# Altium footprint library ASM001-design.PcbLib: 42 footprints (part 2 of 3)
Each footprint in its own frame and in the unit in brackets; x right, y up, seen from the top. Pads: shape width x height; smd on the part's side, far side on the other; paste and mask are expansions set on the pad; w line width, h text height; cw(c..) or ccw(c..) is an arc to the next point about the centre after c.
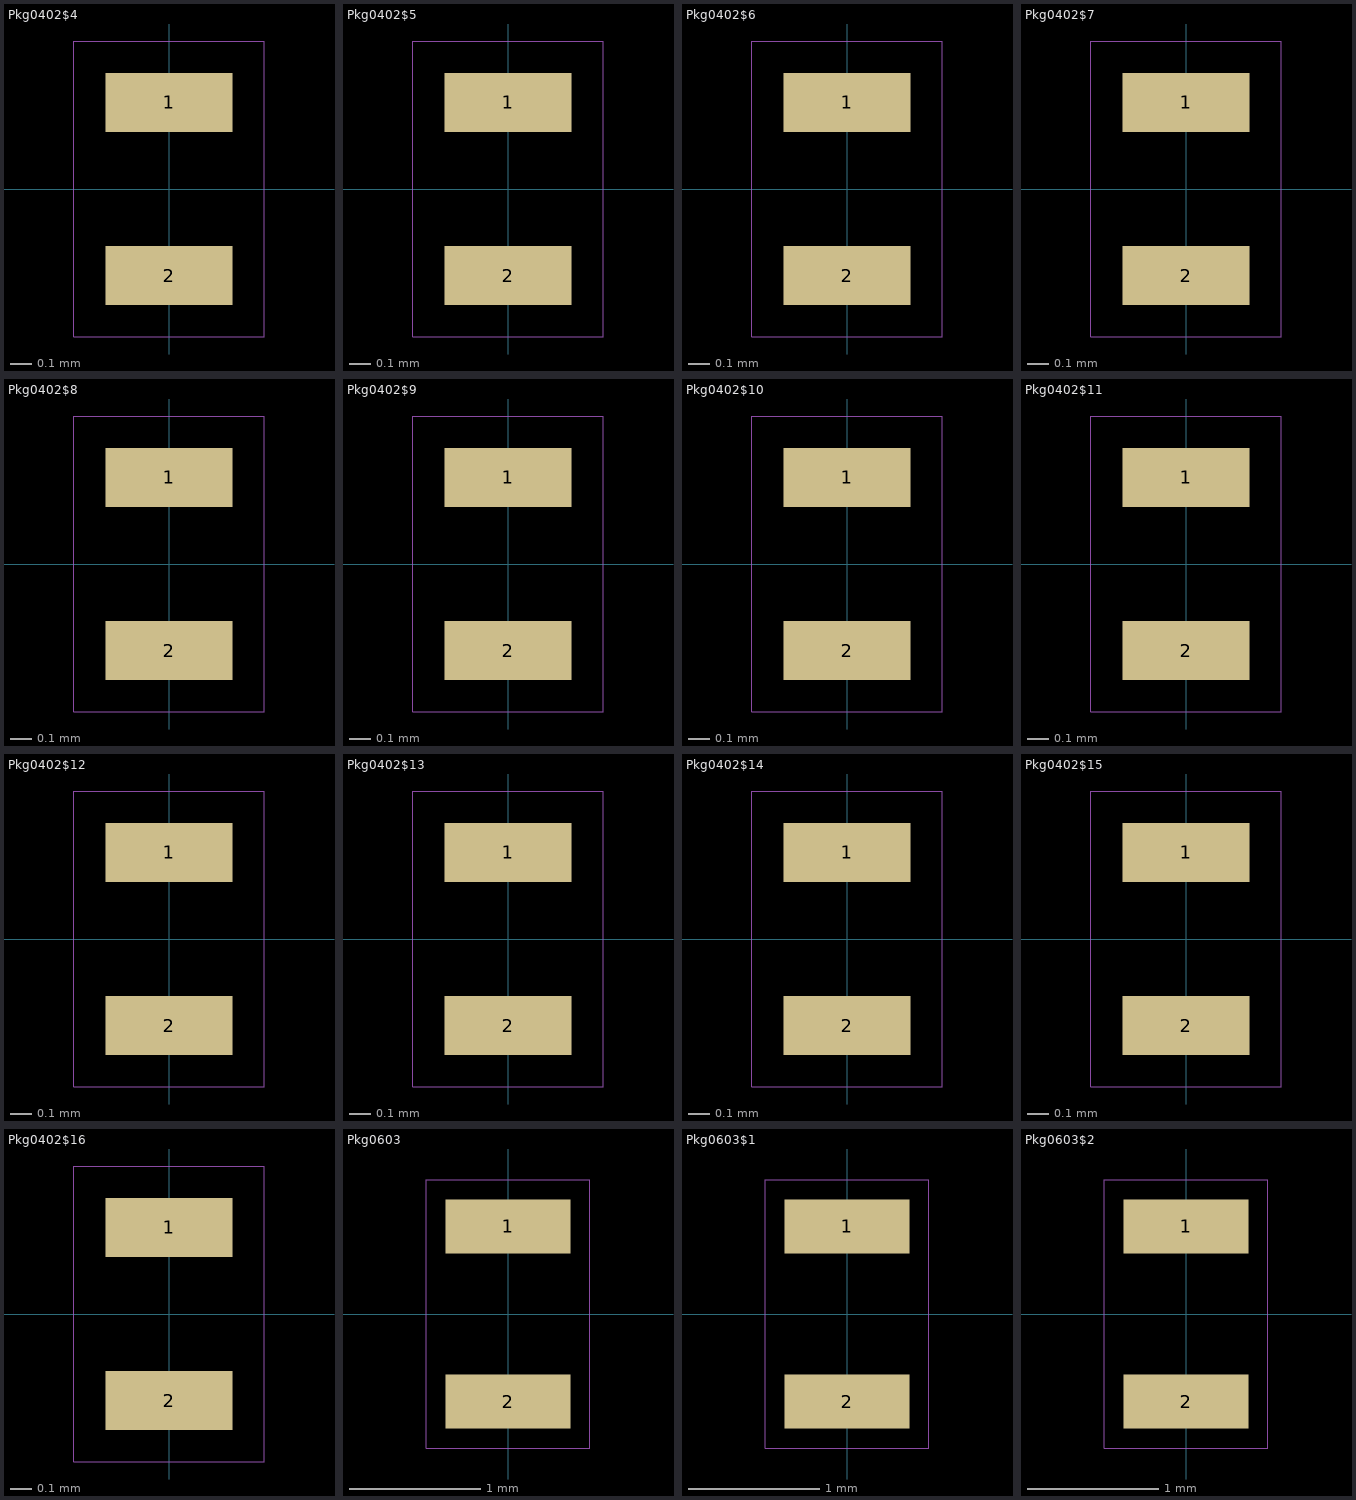
[diagram p1: the footprints below, top view; thin cyan lines are the x and y axes]

## Pkg0402$4 [mm] "Pkg0402$4"
height 1
pads (2):
  rect 0.6x0.28 smd: 1(0,0.41) 2(0,-0.41)
Mechanical 3:
  lines w0.001: -0.45,-0.7 -0.45,0.7 0.45,0.7 0.45,-0.7 -0.45,-0.7
3D body "jitx-64d1eb60b789d8dc4b8da161.stp": height 0, standoff 0, extent -0.25,-0.5 0.25,0.5

## Pkg0402$5 [mm] "Pkg0402$5"
height 1
pads (2):
  rect 0.6x0.28 smd: 1(0,0.41) 2(0,-0.41)
Mechanical 3:
  lines w0.001: -0.45,-0.7 -0.45,0.7 0.45,0.7 0.45,-0.7 -0.45,-0.7
3D body "jitx-64d13eb0b789d8dc4b79e9c7.stp": height 0, standoff 0, extent -0.25,-0.5 0.25,0.5

## Pkg0402$6 [mm] "Pkg0402$6"
height 1
pads (2):
  rect 0.6x0.28 smd: 1(0,0.41) 2(0,-0.41)
Mechanical 3:
  lines w0.001: -0.45,-0.7 -0.45,0.7 0.45,0.7 0.45,-0.7 -0.45,-0.7

## Pkg0402$7 [mm] "Pkg0402$7"
height 1
pads (2):
  rect 0.6x0.28 smd: 1(0,0.41) 2(0,-0.41)
Mechanical 3:
  lines w0.001: -0.45,-0.7 -0.45,0.7 0.45,0.7 0.45,-0.7 -0.45,-0.7

## Pkg0402$8 [mm] "Pkg0402$8"
height 1
pads (2):
  rect 0.6x0.28 smd: 1(0,0.41) 2(0,-0.41)
Mechanical 3:
  lines w0.001: -0.45,-0.7 -0.45,0.7 0.45,0.7 0.45,-0.7 -0.45,-0.7
3D body "jitx-64d1eb60b789d8dc4b8da161.stp": height 0, standoff 0, extent -0.25,-0.5 0.25,0.5

## Pkg0402$9 [mm] "Pkg0402$9"
height 1
pads (2):
  rect 0.6x0.28 smd: 1(0,0.41) 2(0,-0.41)
Mechanical 3:
  lines w0.001: -0.45,-0.7 -0.45,0.7 0.45,0.7 0.45,-0.7 -0.45,-0.7
3D body "jitx-64d13eb0b789d8dc4b79e9c7.stp": height 0, standoff 0, extent -0.25,-0.5 0.25,0.5

## Pkg0402$10 [mm] "Pkg0402$10"
height 1
pads (2):
  rect 0.6x0.28 smd: 1(0,0.41) 2(0,-0.41)
Mechanical 3:
  lines w0.001: -0.45,-0.7 -0.45,0.7 0.45,0.7 0.45,-0.7 -0.45,-0.7

## Pkg0402$11 [mm] "Pkg0402$11"
height 1
pads (2):
  rect 0.6x0.28 smd: 1(0,0.41) 2(0,-0.41)
Mechanical 3:
  lines w0.001: -0.45,-0.7 -0.45,0.7 0.45,0.7 0.45,-0.7 -0.45,-0.7
3D body "jitx-64d1eb60b789d8dc4b8da161.stp": height 0, standoff 0, extent -0.25,-0.5 0.25,0.5

## Pkg0402$12 [mm] "Pkg0402$12"
height 1
pads (2):
  rect 0.6x0.28 smd: 1(0,0.41) 2(0,-0.41)
Mechanical 3:
  lines w0.001: -0.45,-0.7 -0.45,0.7 0.45,0.7 0.45,-0.7 -0.45,-0.7

## Pkg0402$13 [mm] "Pkg0402$13"
height 1
pads (2):
  rect 0.6x0.28 smd: 1(0,0.41) 2(0,-0.41)
Mechanical 3:
  lines w0.001: -0.45,-0.7 -0.45,0.7 0.45,0.7 0.45,-0.7 -0.45,-0.7
3D body "jitx-64d13eb0b789d8dc4b79e9c7.stp": height 0, standoff 0, extent -0.25,-0.5 0.25,0.5

## Pkg0402$14 [mm] "Pkg0402$14"
height 1
pads (2):
  rect 0.6x0.28 smd: 1(0,0.41) 2(0,-0.41)
Mechanical 3:
  lines w0.001: -0.45,-0.7 -0.45,0.7 0.45,0.7 0.45,-0.7 -0.45,-0.7
3D body "jitx-64d13eb0b789d8dc4b79e9c7.stp": height 0, standoff 0, extent -0.25,-0.5 0.25,0.5

## Pkg0402$15 [mm] "Pkg0402$15"
height 1
pads (2):
  rect 0.6x0.28 smd: 1(0,0.41) 2(0,-0.41)
Mechanical 3:
  lines w0.001: -0.45,-0.7 -0.45,0.7 0.45,0.7 0.45,-0.7 -0.45,-0.7
3D body "jitx-64d1eb60b789d8dc4b8da161.stp": height 0, standoff 0, extent -0.25,-0.5 0.25,0.5

## Pkg0402$16 [mm] "Pkg0402$16"
height 1
pads (2):
  rect 0.6x0.28 smd: 1(0,0.41) 2(0,-0.41)
Mechanical 3:
  lines w0.001: -0.45,-0.7 -0.45,0.7 0.45,0.7 0.45,-0.7 -0.45,-0.7

## Pkg0603 [mm] "Pkg0603"
height 1
pads (2):
  rect 0.95x0.412 smd: 1(0,0.669) 2(0,-0.669)
Mechanical 3:
  lines w0.001: -0.625,-1.025 -0.625,1.025 0.625,1.025 0.625,-1.025 -0.625,-1.025

## Pkg0603$1 [mm] "Pkg0603$1"
height 1
pads (2):
  rect 0.95x0.412 smd: 1(0,0.669) 2(0,-0.669)
Mechanical 3:
  lines w0.001: -0.625,-1.025 -0.625,1.025 0.625,1.025 0.625,-1.025 -0.625,-1.025
3D body "jitx-64d1e81cb789d8dc4b8d496b.stp": height 0, standoff 0, extent -0.4,-0.8 0.4,0.8

## Pkg0603$2 [mm] "Pkg0603$2"
height 1
pads (2):
  rect 0.95x0.412 smd: 1(0,0.669) 2(0,-0.669)
Mechanical 3:
  lines w0.001: -0.625,-1.025 -0.625,1.025 0.625,1.025 0.625,-1.025 -0.625,-1.025
3D body "jitx-64d1e81cb789d8dc4b8d496b.stp": height 0, standoff 0, extent -0.4,-0.8 0.4,0.8